# Altium footprint library SMT.PcbLib: 379 footprints (part 7 of 24)
Each footprint in its own frame and in the unit in brackets; x right, y up, seen from the top. Pads: shape width x height; smd on the part's side, far side on the other; paste and mask are expansions set on the pad; w line width, h text height; cw(c..) or ccw(c..) is an arc to the next point about the centre after c.
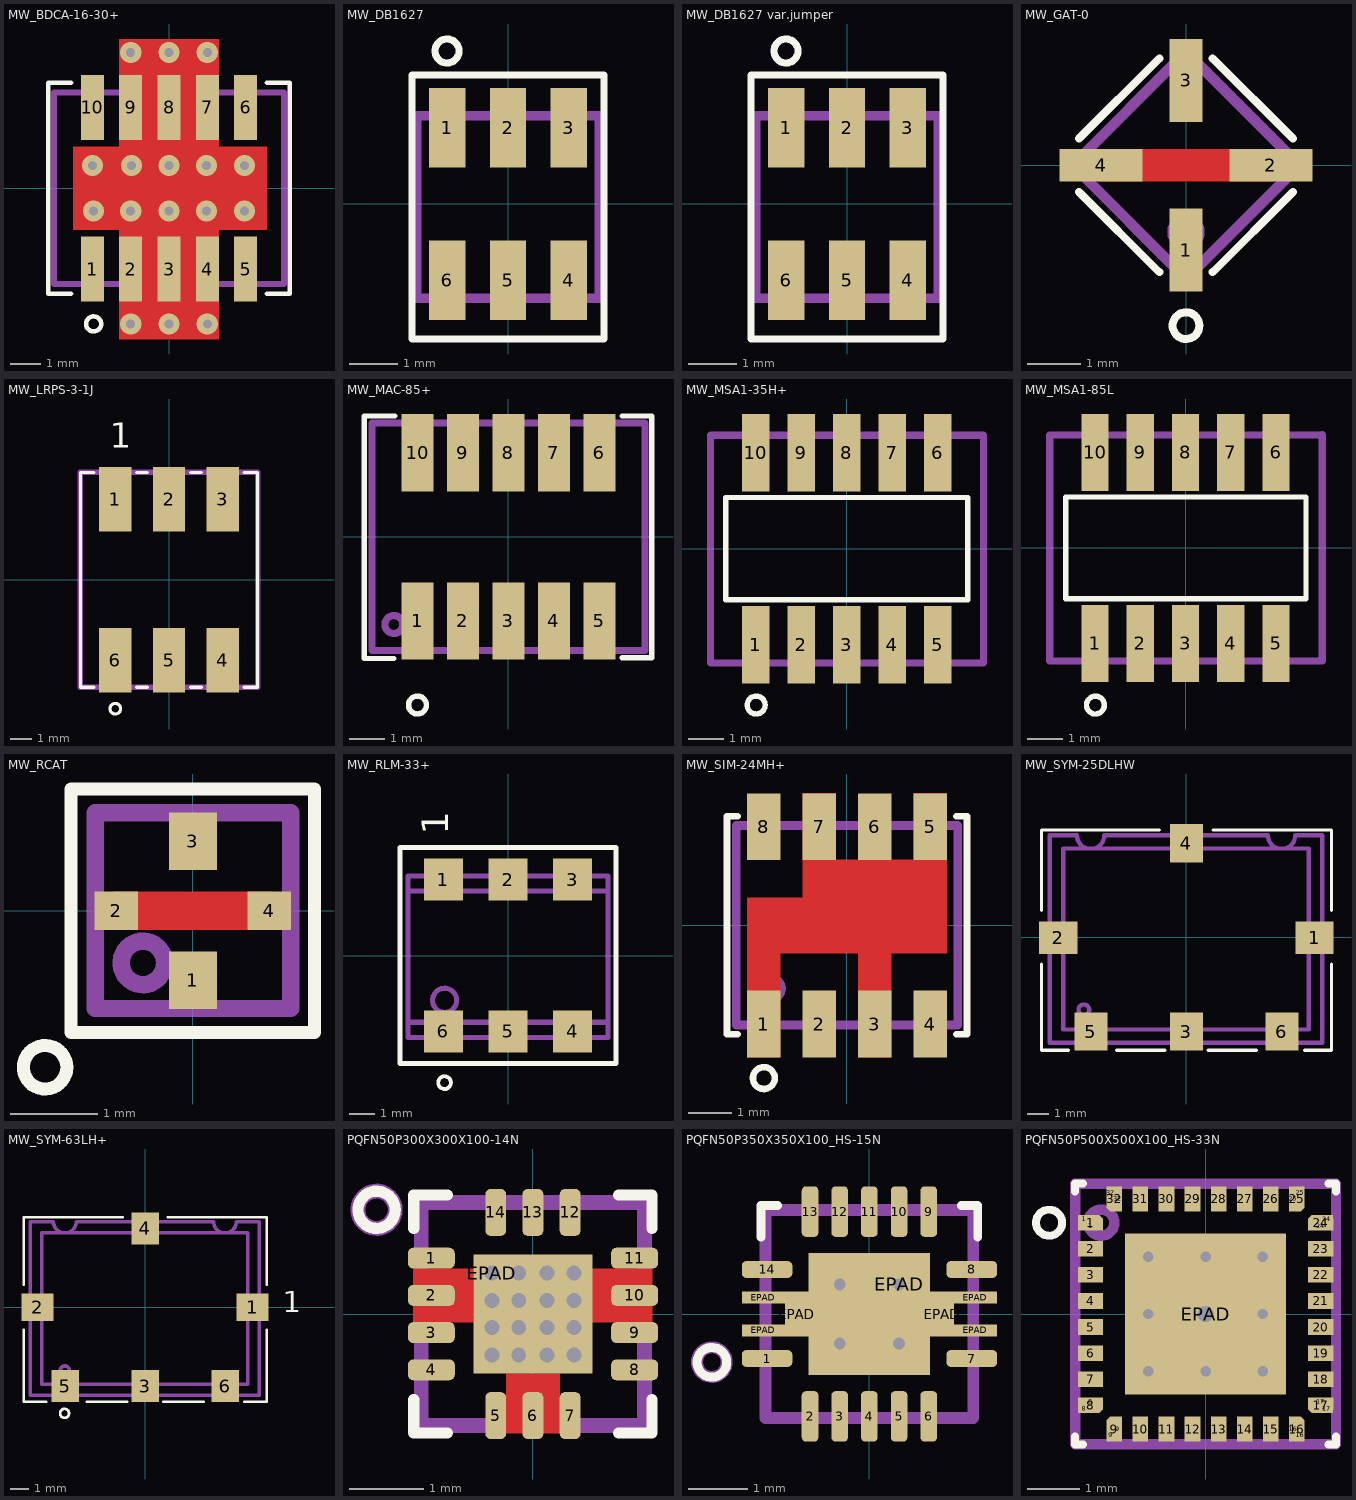
[diagram p6: the footprints below, top view; thin cyan lines are the x and y axes]

## MW_BDCA-16-30+ [mil] "Bi-directionak Coupler, surface mount"
height 51.97
pads (10):
  rect 30x85 smd: 1(-100,-105.5) 2(-50,-105.5) 3(0,-105.5) 4(50,-105.5) 5(100,-105.5) 6(100,105.5) 7(50,105.5) 8(0,105.5) 9(-50,105.5) 10(-100,105.5)
via 0,29.53 diameter 27.56 hole 11.81
via -49.21,29.53 diameter 27.56 hole 11.81
via -100,29.53 diameter 27.56 hole 11.81
via 49.21,29.53 diameter 27.56 hole 11.81
via 98.43,29.53 diameter 27.56 hole 11.81
via 98.43,-29.53 diameter 27.56 hole 11.81
via 49.21,-29.53 diameter 27.56 hole 11.81
via 0,-29.53 diameter 27.56 hole 11.81
via -50,-29.53 diameter 27.56 hole 11.81
via -98.43,-29.53 diameter 27.56 hole 11.81
via -50,177.17 diameter 27.56 hole 11.81
via 0,177.17 diameter 27.56 hole 11.81
via 50,177.17 diameter 27.56 hole 11.81
via -50,-177.17 diameter 27.56 hole 11.81
via 0,-177.17 diameter 27.56 hole 11.81
via 50,-177.17 diameter 27.56 hole 11.81
Top Layer:
  region: -64.96,194.88 64.96,194.88 64.96,54.13 127.95,54.13 127.95,-54.13 64.96,-54.13 64.96,-196.85 -64.96,-196.85 -64.96,-54.13 -125,-54.13 -125,54.13 -64.96,54.13
Top Overlay:
  circle w5.91: c-98.43,-177.17 r9.84
  lines w5.91: -127.95,-137.8 -157.48,-137.8 -157.48,137.8 -127.95,137.8 ; 127.95,-137.8 157.48,-137.8 157.48,137.8 127.95,137.8
Mechanical 1:
  circle w7.87: c-100,-100 r9.84
  lines w7.87: -150,-125 -150,125 150,125 150,-125 -150,-125
3D body "BDCA-16-30.stp": height 56.39, standoff 0.48, extent -150,-133.06 150,133.08

## MW_DB1627 [mm] "SMT RF Transformer"
height 4
pads (6):
  rect 0.76x1.65 smd: 1(-1.27,1.587) 2(0,1.587) 3(1.27,1.587) 4(1.27,-1.587) 5(0,-1.587) 6(-1.27,-1.587)
Top Overlay:
  circle w0.15: c-1.27,3.187 r0.25
  lines w0.15: -2,-2.813 -2,2.686 2,2.686 2,-2.813 -2,-2.813
Mechanical 1:
  circle w0.2: c-1.27,1.333 r0.25
  lines w0.2: -1.905,-1.968 1.905,-1.968 1.905,1.841 -1.905,1.841 -1.905,-1.968
3D body "SW3dPS-tcp-2-10.STEP": height 4.1, standoff 0, extent -1.966,-2.428 1.902,2.398

## MW_DB1627 var.jumper [mm] "SMT RF Transformer"
height 4
pads (6):
  rect 0.76x1.65 smd: 1(-1.27,1.587) 2(0,1.587) 3(1.27,1.587) 4(1.27,-1.587) 5(0,-1.587) 6(-1.27,-1.587)
Top Overlay:
  circle w0.15: c-1.27,3.187 r0.25
  lines w0.15: -2,-2.813 2,-2.813 2,2.686 -2,2.686 -2,-2.813
Mechanical 1:
  circle w0.2: c-1.27,1.333 r0.25
  lines w0.2: -1.905,-1.968 -1.905,1.841 1.905,1.841 1.905,-1.968 -1.905,-1.968
3D body "SW3dPS-tcp-2-10.STEP": height 4.1, standoff 0, extent -1.966,-2.428 1.902,2.398

## MW_GAT-0 [mil] "Miniature package MCLP™ 3x3 mm"
height 35.04
pads (4):
  rect 24x61 smd: 1(0,-62.5) 3(0,62.5)
  rect 61x24 smd: 2(62.5,0) 4(-62.5,0)
Top Layer:
  lines w24: -62.5,0 62.5,0
Top Overlay:
  circle w5.91: c0,-118.11 r9.84
  lines w5.91: -78.74,-19.68 -19.68,-78.74 ; -78.74,19.68 -19.68,78.74 ; 19.68,-78.74 78.74,-19.68 ; 19.68,78.74 78.74,19.68
Mechanical 1:
  circle w7.87: c0,-49.21 r9.84
  lines w7.87: -83.51,0 0.01,-83.51 83.53,0 0.01,83.52 -83.51,0
3D body "FG873.stp": height 35.52, standoff 0.48, extent -83.51,-83.51 83.53,83.52

## MW_LRPS-3-1J [mm] "SMT 9.91X7.87X5.72mm"
height 5.72
pads (6):
  rect 1.52x3.05 smd: 1(-2.54,3.81) 2(0,3.81) 3(2.54,3.81) 4(2.54,-3.81) 5(0,-3.81) 6(-2.54,-3.81)
Top Layer:
  lines w0.254: -2.794,2.54 -2.794,2.667
Top Overlay:
  circle w0.15: c-2.54,-6.096 r0.25
  lines w0.15: -3.556,-5.08 -4.191,-5.08 -4.191,5.08 -3.556,5.08 ; -1.524,-5.08 -1.016,-5.08 ; -1.524,5.08 -1.016,5.08 ; 1.016,-5.08 1.524,-5.08 ; 1.016,5.08 1.524,5.08 ; 3.556,-5.08 4.191,-5.08 4.191,5.08 3.556,5.08
  text "1" at -2.794,5.842 h2
Mechanical 1:
  circle w0.2: c-2.54,4.318 r0.25
  lines w0.2: -4.191,-5.08 -4.191,5.08 4.191,5.08 4.191,-5.08 -4.191,-5.08
Mechanical 3:
  circle w0.2: c-2.54,4.318 r0.25
  lines w0.254: -4.191,-5.08 -4.191,5.08 4.191,5.08 4.191,-5.08 -4.191,-5.08
3D body "User Library-Mini-circuits_QQQ569.STEP": height 5.65, standoff -0.04, extent -3.935,-5.143 3.935,5.144

## MW_MAC-85+ [mm] "SMT  frequency mixer small size 7.62x6.35x1.52"
height 1.524
pads (10):
  rect 0.9x2.16 smd: 1(-2.54,-2.349) 2(-1.27,-2.349) 3(0,-2.349) 4(1.27,-2.349) 5(2.54,-2.349) 6(2.54,2.349) 7(1.27,2.349) 8(0,2.349) 9(-1.27,2.349) 10(-2.54,2.349)
Top Overlay:
  circle w0.15: c-2.54,-4.699 r0.25
  lines w0.15: -3.2,-3.4 -4.025,-3.4 -4.025,3.375 -3.175,3.375 ; 3.175,-3.375 4,-3.375 4,3.375 3.175,3.375
Mechanical 1:
  circle w0.2: c-3.2,-2.45 r0.25
  lines w0.2: 3.8,-3.175 -3.81,-3.175 -3.81,3.175 3.81,3.175 ; 3.8,3.175 3.81,3.175 ; 3.81,-3.175 3.81,3.175
3D body "DZ1650.stp": height 1.52, standoff 0, extent -3.81,-3.175 3.81,3.175

## MW_MSA1-35H+ [mil] "SMT frequency mixer small size 0.25”x0.3”x0.2”"
height 190.16
pads (10):
  rect 30x85 smd: 1(-100,-105.5) 2(-50,-105.5) 3(0,-105.5) 4(50,-105.5) 5(100,-105.5) 6(100,105.5) 7(50,105.5) 8(0,105.5) 9(-50,105.5) 10(-100,105.5)
Top Overlay:
  circle w5.91: c-99.61,-171.65 r9.84
  lines w5.91: -132.87,-55.91 133,-55.91 133,56.3 -132.87,56.3 -132.87,-55.91
Mechanical 1:
  circle w7.87: c-99.41,-93.7 r9.84
  lines w7.87: -149.8,-125.39 -149.8,124.61 150.2,124.61 150.2,-125.39 -149.8,-125.39
3D body "MCA-35H+.stp": height 194.69, standoff 0.6, extent -150,-136.22 150,137.8

## MW_MSA1-85L [mil] "SMT frequency mixer small size 0.25”x0.3”x0.085”"
height 85.04
pads (10):
  rect 30x85 smd: 1(-100,-105.5) 2(-50,-105.5) 3(0,-105.5) 4(50,-105.5) 5(100,-105.5) 6(100,105.5) 7(50,105.5) 8(0,105.5) 9(-50,105.5) 10(-100,105.5)
Top Overlay:
  circle w5.91: c-99.61,-173.62 r9.84
  lines w5.91: -132.5,-56.3 133,-56.3 133,56.3 -132.5,56.3 -132.5,-56.3
Mechanical 1:
  circle w5.91: c-99.8,-99.21 r9.84
  lines w7.87: 150,-125 -150,-125 -150,125 150,125 ; 150.98,-124.61 150.98,125.39
3D body "User Library-MCA1-12GL.STEP": height 86.03, standoff 0.6, extent -150,-136.22 150,137.8

## MW_RCAT [mm] "Miniature size 2.25 mm x 2.25 mm x 1.1 mm Ceramic package"
height 1.1
pads (4):
  rect 0.55x0.66 smd mask+0.07: 1(0,-0.8) 3(0,0.8)
  rect 0.5x0.44 smd mask+0.05: 2(-0.88,0) 4(0.88,0)
Top Layer:
  lines w0.44: -0.88,0 0.88,0
Top Overlay:
  circle w0.15: c-1.7,-1.8 r0.25
  lines w0.15: -1.4,-1.4 1.4,-1.4 1.4,1.4 -1.4,1.4 -1.4,-1.4
Top Paste:
  rectangle: -0.275,-0.22 0.275,0.22
Top Solder:
  rectangle: -1.2,-0.275 1.2,0.275
Mechanical 1:
  circle w0.2: c-0.575,-0.6 r0.25
  lines w0.2: -1.125,-1.125 -1.125,1.125 1.125,1.125 1.125,-1.125 -1.125,-1.125
3D body "LZ1737.stp": height 1.11, standoff 0.01, extent -1.125,-1.125 1.125,1.125

## MW_RLM-33+ [mil] "Surface mount 6.35x7.87x4.06"
height 161.42
pads (6):
  rect 60x65 smd: 1(-100,117.5) 2(0,117.5) 3(100,117.5) 4(100,-117.5) 5(0,-117.5) 6(-100,-117.5)
Top Overlay:
  circle w5.91: c-98.23,-196.85 r9.84
  lines w7.87: -167.32,-167.32 -167.32,167.32 167.32,167.32 167.32,-167.32 -167.32,-167.32
  text "1" at -78.74,187.01 h70.87
Mechanical 1:
  circle w7.87: c-98.23,-69.33 r18.7
  lines w7.87: -104.29,-103.39 ccw(c-99.8,-126.84) -123.68,-126.84 -154.92,-126.84 -154.92,-103.39 ; -104.29,99.71 cw(c-99.8,123.16) -123.68,123.16 -154.92,123.16 -154.92,99.71 ; -95.32,-103.39 cw(c-99.8,-126.84) -75.92,-126.84 -23.88,-126.84 cw(c0,-126.84) -4.49,-103.39 ; -95.32,99.71 ccw(c-99.8,123.16) -75.92,123.16 -23.88,123.16 ccw(c0,123.16) -4.49,99.71 ; 4.49,-103.39 cw(c0,-126.84) 23.88,-126.84 76.12,-126.84 cw(c100,-126.84) 95.51,-103.39 ; 4.49,99.71 ccw(c0,123.16) 23.88,123.16 76.12,123.16 ccw(c100,123.16) 95.51,99.71 ; 104.49,-103.39 cw(c100,-126.84) 123.88,-126.84 154.92,-126.84 154.92,-103.39 ; 104.49,99.71 ccw(c100,123.16) 123.88,123.16 154.92,123.16 154.92,99.71 ; -154.92,-103.39 154.92,-103.39 ; -154.92,-103.39 -154.92,99.71 ; -154.92,99.71 154.92,99.71 ; 154.92,-103.39 154.92,99.71
3D body "User Library-RLM 751.STEP": height 162.48, standoff 0.48, extent -154.92,-124.99 154.93,125

## MW_SIM-24MH+ [mil] "SMT 5.08X4.57X2.21mm"
height 87.01
pads (8):
  rect 30x60 smd: 1(-75,-89) 2(-25,-89) 3(25,-89) 4(75,-89) 5(75,89) 6(25,89) 7(-25,89) 8(-75,89)
Top Layer:
  region: -90,-119 -90,25 -40,25 -40,119 -10,119 -10,59 60,59 60,119 90,119 90,-25 40,-25 40,-119 10,-119 10,-25 -60,-25 -60,-119
Top Overlay:
  circle w5.91: c-75,-137.8 r9.84
  lines w5.91: -98.43,-98.43 -108.27,-98.43 -108.27,98.43 -98.43,98.43 ; 98.43,-98.43 108.27,-98.43 108.27,98.43 98.43,98.43
Top Solder:
  region: -44,123 -6,123 -6,60 56,60 56,123 94,123 94,-29 44,-29 44,-123 6,-123 6,-29 -56,-29 -56,-123 -94,-123 -94,29 -44,29
Mechanical 1:
  circle w7.87: c-69,-57 r9.84
  lines w7.87: -99.99,-89.95 -99.99,89.97 100.01,89.97 100.01,-89.95 -99.99,-89.95
3D body "HV1195.stp": height 87.49, standoff 0.48, extent -99.99,-89.95 100.01,89.97

## MW_SYM-25DLHW [mil] "Surface mount 9.65x12.7x5.84"
height 229.92
pads (6):
  rect 70x60 smd: 1(235,-0.5) 2(-235,-0.5)
  rect 60x70 smd: 3(0,-172.5) 4(0,172.5) 5(-175,-172.5) 6(175,-172.5)
Top Overlay:
  lines w5.91: -265.75,-49.21 -265.75,-206.69 -216.54,-206.69 ; -265.75,49.21 -265.75,196.85 -49.21,196.85 ; -127.95,-206.69 -39.37,-206.69 ; 39.37,-206.69 127.95,-206.69 ; 49.21,196.85 265.75,196.85 265.75,49.21 ; 216.54,-206.69 265.75,-206.69 265.75,-49.21
Mechanical 1:
  circle w7.87: c-188.14,-132.7 r9.84
  lines w7.87: -182.25,162.94 cw(c-175.63,187.05) -200.63,187.05 -250.83,187.05 -250.83,25.04 cw(c-250.83,0.04) -250.83,-24.96 -250.83,-192.88 -25.83,-192.88 cw(c-0.83,-192.88) -7.45,-168.77 ; -169.01,162.94 ccw(c-175.63,187.05) -150.63,187.05 -25.63,187.05 ccw(c-0.63,187.05) -7.25,162.94 ; 5.79,-168.77 cw(c-0.83,-192.88) 24.17,-192.88 249.17,-192.88 249.17,-24.96 cw(c249.17,0.04) 249.17,25.04 249.17,187.05 199.37,187.05 cw(c174.37,187.05) 180.99,162.94 ; 5.99,162.94 ccw(c-0.63,187.05) 24.37,187.05 149.37,187.05 ccw(c174.37,187.05) 167.75,162.94 ; -225.73,-168.77 -225.73,162.94 224.07,162.94 224.07,-168.77 -225.73,-168.77
3D body "SYM-25DLHW.stp": height 230.4, standoff 0.48, extent -249.99,-189.96 250.01,189.97

## MW_SYM-63LH+ [mil] "SMT Frequency Mixer 9.65x12.7x3.81"
height 150
pads (6):
  rect 70x60 smd: 1(235,-0.5) 2(-235,-0.5)
  rect 60x70 smd: 3(0,-172.5) 4(0,172.5) 5(-175,-172.5) 6(175,-172.5)
Top Overlay:
  circle w5.91: c-176.15,-232.05 r9.84
  lines w5.91: -265.75,-49.21 -265.75,-206.69 -216.54,-206.69 ; -265.75,49.21 -265.75,196.85 -49.21,196.85 ; -127.95,-206.69 -39.37,-206.69 ; 39.37,-206.69 127.95,-206.69 ; 49.21,196.85 265.75,196.85 265.75,49.21 ; 216.54,-206.69 265.75,-206.69 265.75,-49.21
  text "1" at 301.3,-26.25 h78.74
Mechanical 1:
  circle w7.87: c-175.55,-138.3 r9.84
  lines w7.87: -182.25,162.94 cw(c-175.63,187.05) -200.63,187.05 -250.83,187.05 -250.83,25.04 cw(c-250.83,0.04) -250.83,-24.96 -250.83,-192.88 -25.83,-192.88 cw(c-0.83,-192.88) -7.45,-168.77 ; -169.01,162.94 ccw(c-175.63,187.05) -150.63,187.05 -25.63,187.05 ccw(c-0.63,187.05) -7.25,162.94 ; 5.79,-168.77 cw(c-0.83,-192.88) 24.17,-192.88 249.17,-192.88 249.17,-24.96 cw(c249.17,0.04) 249.17,25.04 249.17,187.05 199.37,187.05 cw(c174.37,187.05) 180.99,162.94 ; 5.99,162.94 ccw(c-0.63,187.05) 24.37,187.05 149.37,187.05 ccw(c174.37,187.05) 167.75,162.94 ; -225.73,-168.77 224.07,-168.77 224.07,162.94 -225.73,162.94 -225.73,-168.77
  text "1" at 179.15,-25.35 h78.74
3D body "TTT166.stp": height 150, standoff 0, extent -249.99,-189.96 250.01,189.97

## PQFN50P300X300X100-14N [mm] "SMD, Body:3.00x3.00x1.00mm, 14-Leads, Pitch 0.50mm, Thermal Pad:1.70x1.70mm"
height 1
pads (15):
  rrect50% 0.63x0.28 smd mask+0.07: 1(-1.365,0.75) 2(-1.365,0.25) 3(-1.365,-0.25) 4(-1.365,-0.75) 8(1.365,-0.75) 9(1.365,-0.25) 10(1.365,0.25) 11(1.365,0.75)
  rrect50% 0.28x0.63 smd mask+0.07: 5(-0.5,-1.365) 6(0,-1.365) 7(0.5,-1.365) 12(0.5,1.365) 13(0,1.365) 14(-0.5,1.365)
  rect 1.6x1.6 hole 0.2 copper offset 0.55,-0.55 mask+0.05: EPAD(-0.55,0.55)
via 0.19,0.55 diameter 0.5 hole 0.2
via -0.19,0.55 diameter 0.5 hole 0.2
via 0.55,0.55 diameter 0.5 hole 0.2
via 0.19,0.18 diameter 0.5 hole 0.2
via -0.19,0.18 diameter 0.5 hole 0.2
via -0.55,0.18 diameter 0.5 hole 0.2
via 0.55,0.18 diameter 0.5 hole 0.2
via 0.19,-0.18 diameter 0.5 hole 0.2
via -0.19,-0.18 diameter 0.5 hole 0.2
via -0.55,-0.18 diameter 0.5 hole 0.2
via 0.55,-0.18 diameter 0.5 hole 0.2
via 0.55,-0.55 diameter 0.5 hole 0.2
via -0.55,-0.55 diameter 0.5 hole 0.2
via -0.19,-0.55 diameter 0.5 hole 0.2
via 0.19,-0.55 diameter 0.5 hole 0.2
Top Layer:
  pour cut-out: -0.14,-1.605 -0.36,-1.605 -0.36,-0.8 0.36,-0.8 0.36,-1.605 0.14,-1.605 0.14,-1.12 0.139,-1.106 0.128,-1.081 0.109,-1.062 0.084,-1.051 0.07,-1.05 -0.07,-1.05 -0.084,-1.051 -0.109,-1.062 -0.128,-1.081 -0.139,-1.106 -0.14,-1.12
  pour cut-out: 1.605,0.11 1.605,-0.11 0.8,-0.11 0.8,0.61 1.605,0.61 1.605,0.39 1.12,0.39 1.106,0.389 1.081,0.378 1.062,0.359 1.051,0.334 1.05,0.32 1.05,0.18 1.051,0.166 1.062,0.141 1.081,0.122 1.106,0.111 1.12,0.11
  pour cut-out: -1.605,0.39 -1.605,0.61 -0.8,0.61 -0.8,-0.11 -1.605,-0.11 -1.605,0.11 -1.12,0.11 -1.106,0.111 -1.081,0.122 -1.062,0.141 -1.051,0.166 -1.05,0.18 -1.05,0.32 -1.051,0.334 -1.062,0.359 -1.081,0.378 -1.106,0.389 -1.12,0.39
Top Overlay:
  circle w0.15: c-2.1,1.4 r0.25
  lines w0.15: -1.6,-1.15 -1.6,-1.6 -1.15,-1.6 ; -1.6,1.15 -1.6,1.6 -1.15,1.6 ; 1.15,-1.6 1.6,-1.6 1.6,-1.15 ; 1.15,1.6 1.6,1.6 1.6,1.15
Top Paste:
  region: 0.375,-0.575 -0.585,0.385 -0.672,0.471 -0.677,0.471 -0.688,0.467 -0.696,0.459 -0.7,0.449 -0.7,0.443 -0.7,-0.67 -0.7,-0.676 -0.695,-0.687 -0.687,-0.695 -0.676,-0.7 -0.67,-0.7 0.445,-0.7 0.45,-0.7 0.46,-0.695 0.467,-0.686 0.471,-0.676 0.471,-0.67
  region: -0.375,0.575 0.585,-0.385 0.672,-0.471 0.677,-0.471 0.688,-0.467 0.696,-0.459 0.7,-0.449 0.7,-0.443 0.7,0.67 0.7,0.676 0.695,0.687 0.687,0.695 0.676,0.7 0.67,0.7 -0.445,0.7 -0.45,0.7 -0.46,0.695 -0.467,0.686 -0.471,0.676 -0.471,0.67
Mechanical 1:
  circle w0.2: c-2.1,1.4 r0.25
  lines w0.05: 0.681,-0.481 -0.5,0.7 ; 0.687,-0.488 ccw(c0.69,-0.478) 0.7,-0.481 0.7,0.67 ccw(c0.67,0.67) 0.67,0.7 -0.5,0.7 ; -0.5,0.7 -0.5,0.7 ; -0.7,-0.69 ccw(c-0.69,-0.69) -0.69,-0.7 0.5,-0.7 -0.7,0.5 -0.7,-0.69
  lines w0.2: -1.5,-1.5 1.5,-1.5 1.5,1.5 -1.5,1.5 -1.5,-1.5
3D body "Микросхема MASW-011102.stp": height 1, standoff 0, extent -1.51,-1.51 1.51,1.51

## PQFN50P350X350X100_HS-15N [mm] "PQFN, 14-Leads, Body 3,50x3,50mm, Pitch 0,50mm/1,50mm, Thermal Pad 2,05x2,05mm, IPC Medium Density"
height 1
pads (21):
  rrect50% 0.85x0.28 smd paste-0.025 mask+0.05: 1(-1.725,-0.75) 7(1.725,-0.75) 8(1.725,0.75) 14(-1.725,0.75)
  rrect50% 0.28x0.85 smd paste-0.025 mask+0.05: 2(-1,-1.725) 3(-0.5,-1.725) 4(0,-1.725) 5(0.5,-1.725) 6(1,-1.725) 9(1,1.725) 10(0.5,1.725) 11(0,1.725) 12(-0.5,1.725) 13(-1,1.725)
  rect 0.725x0.2 smd paste-20 mask+0.05: EPAD(-1.787,-0.275) EPAD(-1.787,0.275) EPAD(1.787,-0.275) EPAD(1.787,0.275)
  rect 0.4x0.75 smd paste-20 mask+0.05: EPAD(-1.225,0) EPAD(1.225,0)
  rect 2.05x2.05 hole 0.2 copper offset -0.5,-0.5 paste-20 mask+0.05: EPAD(0.5,0.5)
via -0.5,0.5 diameter 0.5 hole 0.2
via -0.5,-0.5 diameter 0.5 hole 0.2
via 0.5,-0.5 diameter 0.5 hole 0.2
Top Overlay:
  circle w0.15: c-2.655,-0.815 r0.25
  lines w0.15: -1.825,1.3 -1.825,1.825 -1.55,1.825 ; 1.55,1.825 1.825,1.825 1.825,1.3
Top Paste:
  region: -0.97,-0.97 -0.97,-0.15 -0.15,-0.15 -0.15,-0.97
  region: 0.15,-0.97 0.15,-0.15 0.97,-0.15 0.97,-0.97
  region: 0.15,0.15 0.15,0.97 0.97,0.97 0.97,0.15
  region: 2.125,-0.175 2.125,-0.375 1.225,-0.375 1.225,-0.175
  region: -1.225,-0.175 -1.225,-0.375 -2.125,-0.375 -2.125,-0.175
  region: -1.225,0.375 -1.225,0.175 -2.125,0.175 -2.125,0.375
  region: 2.125,0.375 2.125,0.175 1.225,0.175 1.225,0.375
  region: -0.97,0.15 -0.97,0.97 -0.15,0.97 -0.15,0.15
Mechanical 1:
  circle w0.2: c-2.655,-0.81 r0.25
  lines w0.2: -1.75,-1.75 -1.75,1.75 1.75,1.75 1.75,-1.75 -1.75,-1.75
3D body "QFN50P350X350X100_HS-15N.step": height 1, standoff 0, extent -1.751,-1.751 1.751,1.751

## PQFN50P500X500X100_HS-33N [mm] "PQFN, 32-Leads, Body 5,00x5,00mm, Pitch 0,50mm, Thermal Pad 3,85x3,08mm, IPC Medium Density"
height 1
pads (49):
  rect 0.242x0.17 smd mask+0.05: 1(-2.326,1.815) 8(-2.326,-1.815) 17(2.326,-1.815) 24(2.326,1.815)
  rect 0.485x0.17 smd mask+0.05: 1(-2.205,1.685) 8(-2.205,-1.685) 17(2.205,-1.685) 24(2.205,1.685)
  oct 0.485x0.3 smd mask+0.05: 1(-2.205,1.75) 8(-2.205,-1.75) 17(2.205,-1.75) 24(2.205,1.75)
  rect 0.485x0.3 smd mask+0.05: 2(-2.205,1.25) 3(-2.205,0.75) 4(-2.205,0.25) 5(-2.205,-0.25) 6(-2.205,-0.75) 7(-2.205,-1.25) 18(2.205,-1.25) 19(2.205,-0.75) 20(2.205,-0.25) 21(2.205,0.25) 22(2.205,0.75) 23(2.205,1.25)
  rect 0.17x0.242 smd mask+0.05: 9(-1.815,-2.326) 16(1.815,-2.326) 25(1.815,2.326) 32(-1.815,2.326)
  oct 0.3x0.485 smd mask+0.05: 9(-1.75,-2.205) 16(1.75,-2.205) 25(1.75,2.205) 32(-1.75,2.205)
  rect 0.17x0.485 smd mask+0.05: 9(-1.684,-2.205) 16(1.685,-2.205) 25(1.684,2.205) 32(-1.685,2.205)
  rect 0.3x0.485 smd mask+0.05: 10(-1.25,-2.205) 11(-0.75,-2.205) 12(-0.25,-2.205) 13(0.25,-2.205) 14(0.75,-2.205) 15(1.25,-2.205) 26(1.25,2.205) 27(0.75,2.205) 28(0.25,2.205) 29(-0.25,2.205) 30(-0.75,2.205) 31(-1.25,2.205)
  rect 3.08x3.08 hole 0.3: EPAD(0,0)
via 1.1,-1.1 diameter 0.5 hole 0.2
via 0,-1.1 diameter 0.5 hole 0.2
via -1.1,-1.1 diameter 0.5 hole 0.2
via 1.1,0 diameter 0.5 hole 0.2
via -1.1,0 diameter 0.5 hole 0.2
via 1.1,1.1 diameter 0.5 hole 0.2
via 0,1.1 diameter 0.5 hole 0.2
via -1.1,1.1 diameter 0.5 hole 0.2
Top Overlay:
  circle w0.15: c-3,1.75 r0.25
  lines w0.15: -2.5,-2.35 -2.5,-2.5 -2.35,-2.5 ; -2.5,2.35 -2.5,2.5 -2.35,2.5 ; 2.35,-2.5 2.5,-2.5 2.5,-2.35 ; 2.35,2.5 2.5,2.5 2.5,2.35
Top Paste:
  rectangle: -1,-1 1,1
Mechanical 1:
  circle w0.2: c-2,1.75 r0.25
  lines w0.2: -2.5,-2.5 2.5,-2.5 2.5,2.5 -2.5,2.5 -2.5,-2.5
3D body "PE42441.stp": height 0.94, standoff 0, extent -2.5,-2.5 2.5,2.5